# Altium footprint library TH_Connectors.PcbLib: 83 footprints (part 2 of 6)
Each footprint in its own frame and in the unit in brackets; x right, y up, seen from the top. Pads: shape width x height; smd on the part's side, far side on the other; paste and mask are expansions set on the pad; w line width, h text height; cw(c..) or ccw(c..) is an arc to the next point about the centre after c.
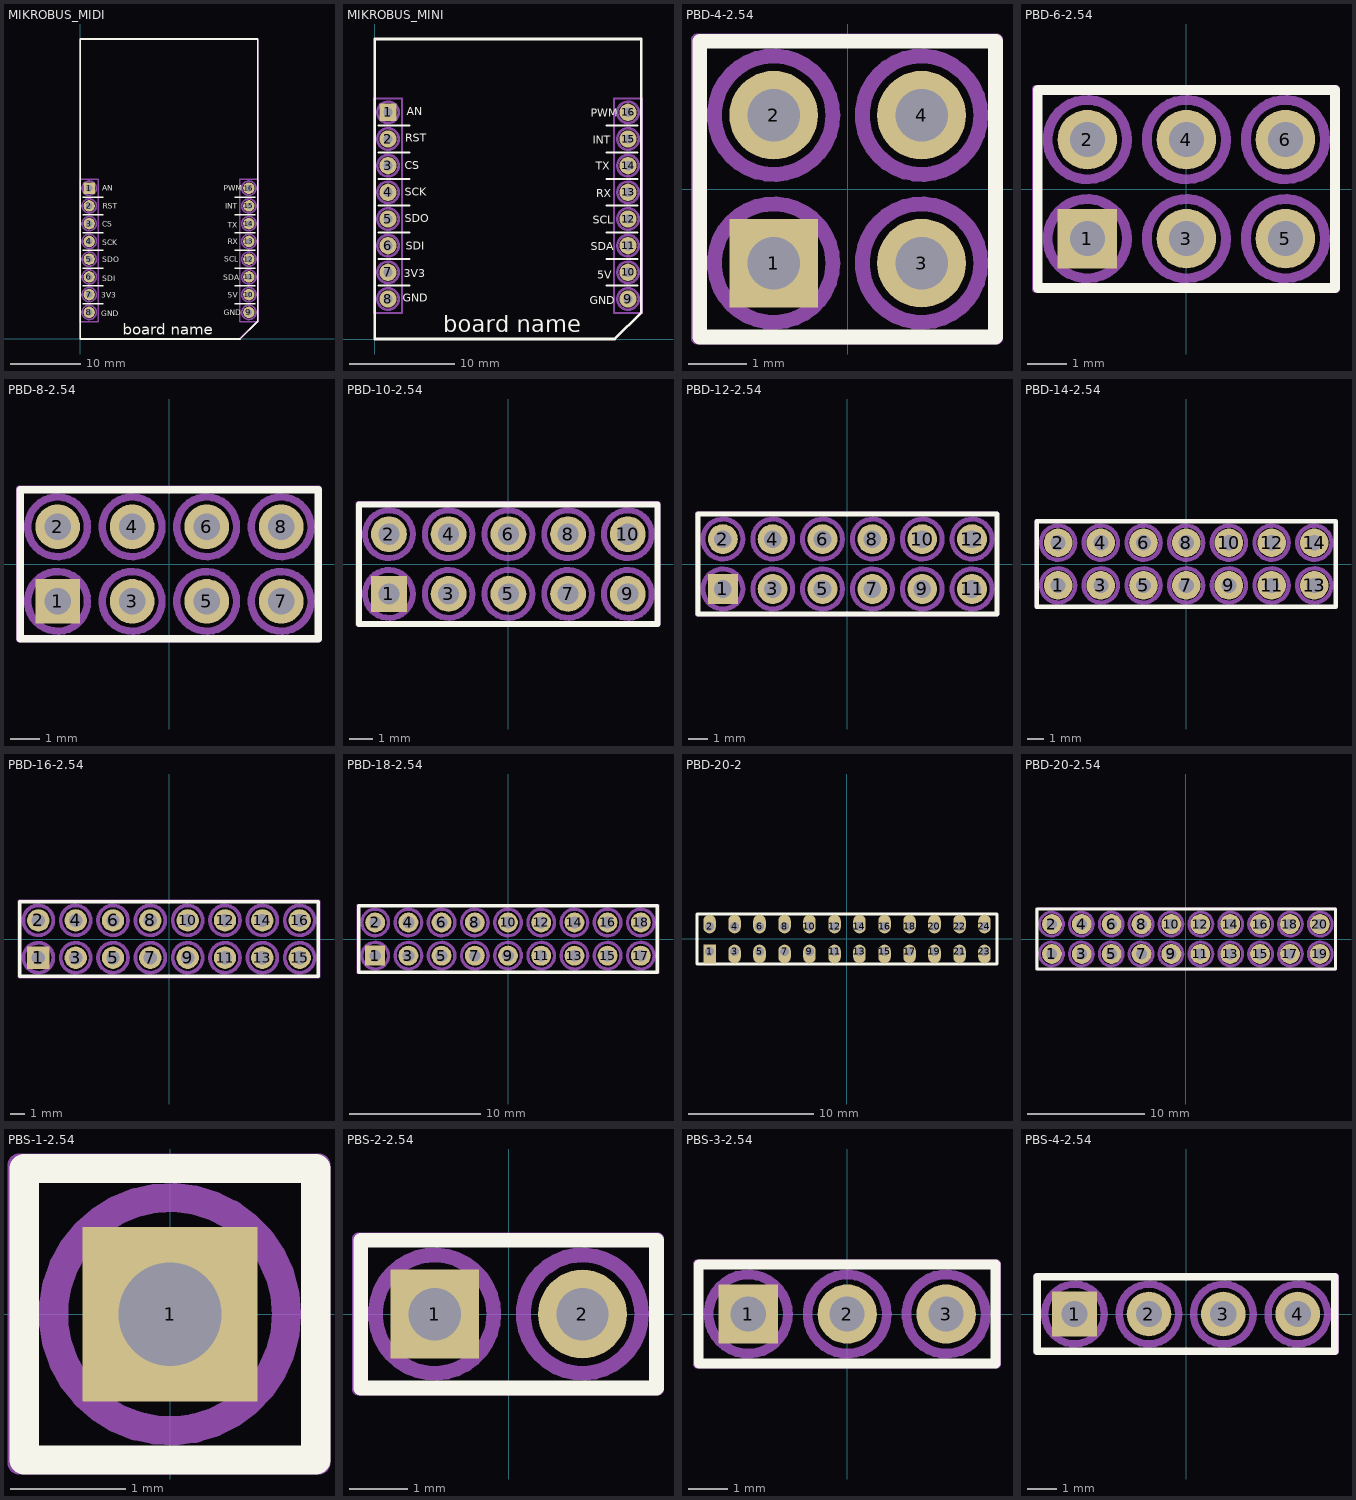
[diagram p1: the footprints below, top view; thin cyan lines are the x and y axes]

## MIKROBUS_MIDI [mil]
height 47.24
pads (16):
  rect 65x65 hole 35: 1(50,850)
  round 65 hole 35: 2(50,750) 3(50,650) 4(50,550) 5(50,450) 6(50,350) 7(50,250) 8(50,150) 9(950,150) 10(950,250) 11(950,350) 12(950,450) 13(950,550) 14(950,650) 15(950,750) 16(950,850)
Top Overlay:
  lines w8: 15,200 130,200 ; 15,300 130,300 ; 15,400 130,400 ; 15,500 130,500 ; 15,600 130,600 ; 15,700 130,700 ; 15,800 130,800 ; 870,200 985,200 ; 870,300 985,300 ; 870,400 985,400 ; 870,500 985,500 ; 870,600 985,600 ; 870,700 985,700 ; 870,800 985,800
  lines w10: 0,0 0,1690 1000,1690 1000,100 900,0 0,0 ; 0,0 0,0
  text "PWM" at 808.34,834.9 h30
  text "CS" at 123.39,632.87 h30
  text "TX" at 831.38,627.56 h30
  text "RX" at 830.49,533.62 h30
  text "SCL" at 810.99,434.38 h30
  text "SDA" at 806.56,332.48 h30
  text "GND" at 808.33,133.11 h30
  text "SDO" at 122.5,432.61 h30
  text "RST" at 125.16,733.88 h30
  text "INT" at 816.31,734.77 h30
  text "SCK" at 122.5,529.19 h30
  text "AN" at 122.5,834.9 h30
  text "SDI" at 122.5,326.27 h30
  text "5V" at 832.25,231.46 h30
  text "3V3" at 118.07,231.47 h30
  text "GND" at 117.18,129.57 h30
  text "board name" at 240.29,22.9 h60.94
Bottom Overlay:
  lines w8: 3,100 100,100 100,900 3,900 ; 997,100 900,100 900,900 997,900
  text "SCK" at 230,530 h35
  text "AN" at 200,830 h35
  text "TX" at 860,630 h35
  text "RX" at 860,530 h35
  text "5V" at 859.72,230.58 h35
  text "GND" at 860,130 h35
  text "PWM" at 860,830 h35
  text "RST" at 230,730 h35
  text "SDA" at 860,330 h35
  text "SDO" at 230,430 h35
  text "3V3" at 230,230 h35
  text "GND" at 233,130 h35
  text "CS" at 195,630 h35
  text "SDI" at 220,330 h35
  text "INT" at 860,730 h35
  text "SCL" at 860,430 h35
Keep-Out Layer:
  lines w6: 0,0 900,0 1000,100 1000,1690 0,1690 0,0
Border:
  lines w7.87: 0,0 0,1690.68 1000,1690.68 1000,100 900,0 0,0
Top Assembly:
  circle w10: c950,150 r40.04
  circle w10: c950,250 r40.04
  circle w10: c950,350 r40.04
  circle w10: c950,450 r40.04
  circle w10: c950,550 r40.04
  circle w10: c950,650 r40.04
  circle w10: c950,750 r40.04
  circle w10: c950,850 r40.04
  circle w10: c50,150 r40.04
  circle w10: c50,250 r40.04
  circle w10: c50,350 r40.04
  circle w10: c50,450 r40.04
  circle w10: c50,550 r40.04
  circle w10: c50,650 r40.04
  circle w10: c50,750 r40.04
  circle w10: c50,850 r40.04
Bottom Assembly:
  lines w7.87: -2.21,97.73 102.02,97.73 102.02,901.64 -2.21,901.64 -2.21,97.73 ; 897.79,97.73 1002.02,97.73 1002.02,901.64 897.79,901.64 897.79,97.73
3D body "User Library-PinHeaderX5-1.STEP": height 81.88, standoff -398.04, extent -7.96,400 107,900
3D body "User Library-PinHeaderX3.STEP": height 81.88, standoff -398.04, extent -7.96,100 107,400
3D body "User Library-PinHeaderX5-1.STEP": height 81.88, standoff -398.04, extent 892.52,400 1007.48,900
3D body "User Library-PinHeaderX3.STEP": height 81.88, standoff -398.04, extent 892.52,100 1007.48,400

## MIKROBUS_MINI [mil]
height 47.24
pads (16):
  rect 65x65 hole 35: 1(50,850)
  round 65 hole 35: 2(50,750) 3(50,650) 4(50,550) 5(50,450) 6(50,350) 7(50,250) 8(50,150) 9(950,150) 10(950,250) 11(950,350) 12(950,450) 13(950,550) 14(950,650) 15(950,750) 16(950,850)
Top Overlay:
  lines w8: 15,200 130,200 ; 15,300 130,300 ; 15,400 130,400 ; 15,500 130,500 ; 15,600 130,600 ; 15,700 130,700 ; 15,800 130,800 ; 870,200 985,200 ; 870,300 985,300 ; 870,400 985,400 ; 870,500 985,500 ; 870,600 985,600 ; 870,700 985,700 ; 870,800 985,800
  lines w10: 0,1125 0,0 900,0 1000,100 1000,1125 0,1125 ; 0,1125 0,1125
  text "GND" at 105.49,140.28 h30
  text "3V3" at 108.79,231.68 h30
  text "5V" at 834.31,225.97 h30
  text "SDI" at 115.77,333.95 h30
  text "AN" at 120.23,838.83 h30
  text "SCK" at 113.62,537.34 h30
  text "INT" at 818.3,731.79 h30
  text "RST" at 115.42,740.34 h30
  text "SDO" at 111.82,437.05 h30
  text "GND" at 805.86,129.97 h30
  text "SDA" at 809.42,332.64 h30
  text "SCL" at 817.42,433.09 h30
  text "RX" at 830.76,531.77 h30
  text "TX" at 828.97,634 h30
  text "CS" at 113.62,636.44 h30
  text "PWM" at 809.41,834.02 h30
  text "board name" at 256.31,25.05 h60.94
Bottom Overlay:
  lines w8: 3,100 100,100 100,900 3,900 ; 997,100 900,100 900,900 997,900
  text "SCL" at 860,430 h35
  text "INT" at 860,730 h35
  text "SDI" at 220,330 h35
  text "CS" at 195,630 h35
  text "GND" at 221.08,130.96 h35
  text "3V3" at 230,230 h35
  text "SDO" at 230,430 h35
  text "SDA" at 860,330 h35
  text "RST" at 230,730 h35
  text "PWM" at 860,830 h35
  text "GND" at 860,130 h35
  text "5V" at 860,230 h35
  text "RX" at 860,530 h35
  text "TX" at 852.98,632.22 h35
  text "AN" at 200,830 h35
  text "SCK" at 230,530 h35
Top Assembly:
  circle w10: c50,850 r40.04
  circle w10: c50,750 r40.04
  circle w10: c50,650 r40.04
  circle w10: c50,550 r40.04
  circle w10: c50,450 r40.04
  circle w10: c50,350 r40.04
  circle w10: c50,250 r40.04
  circle w10: c50,150 r40.04
  circle w10: c950,150 r40.04
  circle w10: c950,250 r40.04
  circle w10: c950,350 r40.04
  circle w10: c950,450 r40.04
  circle w10: c950,550 r40.04
  circle w10: c950,650 r40.04
  circle w10: c950,750 r40.04
  circle w10: c950,850 r40.04
Bottom Assembly:
  lines w7.87: -2.21,97.73 -2.21,901.64 102.02,901.64 102.02,97.73 -2.21,97.73 ; 897.79,97.73 897.79,901.64 1002.02,901.64 1002.02,97.73 897.79,97.73
3D body "User Library-PinHeaderX3.STEP": height 81.88, standoff -398.04, extent 892.52,100 1007.48,400
3D body "User Library-PinHeaderX5-1.STEP": height 81.88, standoff -398.04, extent 892.52,400 1007.48,900
3D body "User Library-PinHeaderX3.STEP": height 81.88, standoff -398.04, extent -7.96,100 107,400
3D body "User Library-PinHeaderX5-1.STEP": height 81.88, standoff -398.04, extent -7.96,400 107,900

## PBD-4-2.54 [mil]
pads (4):
  rect 60x60 hole 35.43: 1(-50,-50)
  round 60 hole 35.43: 2(-50,50) 3(50,-50) 4(50,50)
Top Overlay:
  lines w10: -100,-100 100,-100 100,100 -100,100 -100,-100
Top Assembly:
  lines w7.87: -101.81,-101.12 -101.81,101.38 101.01,101.38 101.01,-101.12 -101.81,-101.12
Bottom Assembly:
  circle w10: c50,-50 r40.05
  circle w10: c-50,-50 r40.05
  circle w10: c-50,50 r40.05
  circle w10: c50,50 r40.05
3D body "PBS1-2.54.stp": height 354.33, standoff -104.33, extent -100,0 0,100
3D body "PBS1-2.54.stp": height 354.33, standoff -104.33, extent -100,-100 0,0
3D body "PBS1-2.54.stp": height 354.33, standoff -104.33, extent 0,-100 100,0
3D body "PBS1-2.54.stp": height 354.33, standoff -104.33, extent 0,0 100,100

## PBD-6-2.54 [mil]
pads (6):
  rect 60x60 hole 35.43: 1(-100,-50)
  round 60 hole 35.43: 2(-100,50) 3(0,-50) 4(0,50) 5(100,-50) 6(100,50)
Top Overlay:
  lines w10: -150,-100 150,-100 150,100 -150,100 -150,-100
Top Assembly:
  lines w7.87: -151.81,-101.12 151.06,-101.12 151.06,101.38 -151.81,101.38 -151.81,-101.12
Bottom Assembly:
  circle w10: c-100,50 r40.05
  circle w10: c-100,-50 r40.05
  circle w10: c0,50 r40.05
  circle w10: c0,-50 r40.05
  circle w10: c100,50 r40.05
  circle w10: c100,-50 r40.05
3D body "PBS1-2.54.stp": height 354.33, standoff -104.33, extent -50,0 50,100
3D body "PBS1-2.54.stp": height 354.33, standoff -104.33, extent -150,0 -50,100
3D body "PBS1-2.54.stp": height 354.33, standoff -104.33, extent -150,-100 -50,0
3D body "PBS1-2.54.stp": height 354.33, standoff -104.33, extent -50,-100 50,0
3D body "PBS1-2.54.stp": height 354.33, standoff -104.33, extent 50,-100 150,0
3D body "PBS1-2.54.stp": height 354.33, standoff -104.33, extent 50,0 150,100

## PBD-8-2.54 [mil]
pads (8):
  rect 60x60 hole 35.43: 1(-150,-50)
  round 60 hole 35.43: 2(-150,50) 3(-50,-50) 4(-50,50) 5(50,-50) 6(50,50) 7(150,-50) 8(150,50)
Top Overlay:
  lines w10: -200,-100 200,-100 200,100 -200,100 -200,-100
Top Assembly:
  lines w7.87: -201.81,-101.12 -201.81,101.38 200.74,101.38 200.74,-101.12 -201.81,-101.12
Bottom Assembly:
  circle w10: c150,50 r40.05
  circle w10: c150,-50 r40.05
  circle w10: c-150,50 r40.05
  circle w10: c-150,-50 r40.05
  circle w10: c-50,50 r40.05
  circle w10: c-50,-50 r40.05
  circle w10: c50,50 r40.05
  circle w10: c50,-50 r40.05
3D body "PBS1-2.54.stp": height 354.33, standoff -104.33, extent -200,0 -100,100
3D body "PBS1-2.54.stp": height 354.33, standoff -104.33, extent -100,0 0,100
3D body "PBS1-2.54.stp": height 354.33, standoff -104.33, extent -100,-100 0,0
3D body "PBS1-2.54.stp": height 354.33, standoff -104.33, extent -200,-100 -100,0
3D body "PBS1-2.54.stp": height 354.33, standoff -104.33, extent 0,0 100,100
3D body "PBS1-2.54.stp": height 354.33, standoff -104.33, extent 0,-100 100,0
3D body "PBS1-2.54.stp": height 354.33, standoff -104.33, extent 100,-100 200,0
3D body "PBS1-2.54.stp": height 354.33, standoff -104.33, extent 100,0 200,100

## PBD-10-2.54 [mil]
pads (10):
  rect 60x60 hole 35.43: 1(-200,-50)
  round 60 hole 35.43: 2(-200,50) 3(-100,-50) 4(-100,50) 5(0,-50) 6(0,50) 7(100,-50) 8(100,50) 9(200,-50) 10(200,50)
Top Overlay:
  lines w10: -250,-100 250,-100 250,100 -250,100 -250,-100
Top Assembly:
  lines w7.87: -251.81,-101.12 -251.81,101.38 250.57,101.38 250.57,-101.12 -251.81,-101.12
Bottom Assembly:
  circle w10: c200,50 r40.05
  circle w10: c200,-50 r40.05
  circle w10: c100,50 r40.05
  circle w10: c100,-50 r40.05
  circle w10: c0,50 r40.05
  circle w10: c0,-50 r40.05
  circle w10: c-100,50 r40.05
  circle w10: c-100,-50 r40.05
  circle w10: c-200,50 r40.05
  circle w10: c-200,-50 r40.05
3D body "PBS1-2.54.stp": height 354.33, standoff -104.33, extent -250,0 -150,100
3D body "PBS1-2.54.stp": height 354.33, standoff -104.33, extent -250,-100 -150,0
3D body "PBS1-2.54.stp": height 354.33, standoff -104.33, extent -150,-100 -50,0
3D body "PBS1-2.54.stp": height 354.33, standoff -104.33, extent -150,0 -50,100
3D body "PBS1-2.54.stp": height 354.33, standoff -104.33, extent -50,0 50,100
3D body "PBS1-2.54.stp": height 354.33, standoff -104.33, extent -50,-100 50,0
3D body "PBS1-2.54.stp": height 354.33, standoff -104.33, extent 50,-100 150,0
3D body "PBS1-2.54.stp": height 354.33, standoff -104.33, extent 50,0 150,100
3D body "PBS1-2.54.stp": height 354.33, standoff -104.33, extent 150,0 250,100
3D body "PBS1-2.54.stp": height 354.33, standoff -104.33, extent 150,-100 250,0

## PBD-12-2.54 [mil]
pads (12):
  rect 60x60 hole 35.43: 1(-250,-50)
  round 60 hole 35.43: 2(-250,50) 3(-150,-50) 4(-150,50) 5(-50,-50) 6(-50,50) 7(50,-50) 8(50,50) 9(150,-50) 10(150,50) 11(250,-50) 12(250,50)
Top Overlay:
  lines w10: -300,-100 -300,100 300,100 300,-100 -300,-100
Top Assembly:
  lines w7.87: -301.81,-101.12 -301.81,101.38 300,101.38 300,-101.12 -301.81,-101.12
Bottom Assembly:
  circle w10: c250,50 r40.05
  circle w10: c250,-50 r40.05
  circle w10: c150,50 r40.05
  circle w10: c150,-50 r40.05
  circle w10: c50,50 r40.05
  circle w10: c50,-50 r40.05
  circle w10: c-50,50 r40.05
  circle w10: c-50,-50 r40.05
  circle w10: c-150,50 r40.05
  circle w10: c-150,-50 r40.05
  circle w10: c-250,50 r40.05
  circle w10: c-250,-50 r40.05
3D body "PBS1-2.54.stp": height 354.33, standoff -104.33, extent -300,0 -200,100
3D body "PBS1-2.54.stp": height 354.33, standoff -104.33, extent -300,-100 -200,0
3D body "PBS1-2.54.stp": height 354.33, standoff -104.33, extent -200,-100 -100,0
3D body "PBS1-2.54.stp": height 354.33, standoff -104.33, extent -200,0 -100,100
3D body "PBS1-2.54.stp": height 354.33, standoff -104.33, extent -100,0 0,100
3D body "PBS1-2.54.stp": height 354.33, standoff -104.33, extent -100,-100 0,0
3D body "PBS1-2.54.stp": height 354.33, standoff -104.33, extent 0,0 100,100
3D body "PBS1-2.54.stp": height 354.33, standoff -104.33, extent 0,-100 100,0
3D body "PBS1-2.54.stp": height 354.33, standoff -104.33, extent 100,0 200,100
3D body "PBS1-2.54.stp": height 354.33, standoff -104.33, extent 100,-100 200,0
3D body "PBS1-2.54.stp": height 354.33, standoff -104.33, extent 200,0 300,100
3D body "PBS1-2.54.stp": height 354.33, standoff -104.33, extent 200,-100 300,0

## PBD-14-2.54 [mm]
pads (14):
  round 1.7 hole 0.9: 1(-7.62,-1.27) 2(-7.62,1.27) 3(-5.08,-1.27) 4(-5.08,1.27) 5(-2.54,-1.27) 6(-2.54,1.27) 7(0,-1.27) 8(0,1.27) 9(2.54,-1.27) 10(2.54,1.27) 11(5.08,-1.27) 12(5.08,1.27) 13(7.62,-1.27) 14(7.62,1.27)
Top Overlay:
  lines w0.254: -8.89,-2.54 -8.89,2.54 8.89,2.54 8.89,-2.54 -8.89,-2.54
Top Assembly:
  lines w0.2: -8.936,-2.569 -8.936,2.575 8.91,2.575 8.91,-2.569 -8.936,-2.569
Bottom Assembly:
  circle w0.254: c7.62,1.27 r1.017
  circle w0.254: c7.62,-1.27 r1.017
  circle w0.254: c5.08,1.27 r1.017
  circle w0.254: c5.08,-1.27 r1.017
  circle w0.254: c2.54,1.27 r1.017
  circle w0.254: c2.54,-1.27 r1.017
  circle w0.254: c0,1.27 r1.017
  circle w0.254: c0,-1.27 r1.017
  circle w0.254: c-2.54,1.27 r1.017
  circle w0.254: c-2.54,-1.27 r1.017
  circle w0.254: c-5.08,1.27 r1.017
  circle w0.254: c-5.08,-1.27 r1.017
  circle w0.254: c-7.62,1.27 r1.017
  circle w0.254: c-7.62,-1.27 r1.017
3D body "PBS1-2.54.stp": height 9, standoff -2.65, extent -8.89,0 -6.35,2.54
3D body "PBS1-2.54.stp": height 9, standoff -2.65, extent -8.89,-2.54 -6.35,0
3D body "PBS1-2.54.stp": height 9, standoff -2.65, extent -6.35,-2.54 -3.81,0
3D body "PBS1-2.54.stp": height 9, standoff -2.65, extent -6.35,0 -3.81,2.54
3D body "PBS1-2.54.stp": height 9, standoff -2.65, extent -3.81,-2.54 -1.27,0
3D body "PBS1-2.54.stp": height 9, standoff -2.65, extent -1.27,-2.54 1.27,0
3D body "PBS1-2.54.stp": height 9, standoff -2.65, extent -1.27,0 1.27,2.54
3D body "PBS1-2.54.stp": height 9, standoff -2.65, extent 1.27,-2.54 3.81,0
3D body "PBS1-2.54.stp": height 9, standoff -2.65, extent 1.27,0 3.81,2.54
3D body "PBS1-2.54.stp": height 9, standoff -2.65, extent 3.81,-2.54 6.35,0
3D body "PBS1-2.54.stp": height 9, standoff -2.65, extent 3.81,0 6.35,2.54
3D body "PBS1-2.54.stp": height 9, standoff -2.65, extent 6.35,-2.54 8.89,0
3D body "PBS1-2.54.stp": height 9, standoff -2.65, extent 6.35,0 8.89,2.54
3D body "PBS1-2.54.stp": height 9, standoff -2.65, extent -3.81,0 -1.27,2.54

## PBD-16-2.54 [mil]
pads (16):
  rect 60x60 hole 35.43: 1(-350,-50)
  round 60 hole 35.43: 2(-350,50) 3(-250,-50) 4(-250,50) 5(-150,-50) 6(-150,50) 7(-50,-50) 8(-50,50) 9(50,-50) 10(50,50) 11(150,-50) 12(150,50) 13(250,-50) 14(250,50) 15(350,-50) 16(350,50)
Top Overlay:
  lines w10: -400,-100 -400,100 400,100 400,-100 -400,-100
Top Assembly:
  lines w7.87: -401.81,-101.12 -401.81,101.38 401.76,101.38 401.76,-101.12 -401.81,-101.12
Bottom Assembly:
  circle w10: c350,50 r40.05
  circle w10: c350,-50 r40.05
  circle w10: c250,50 r40.05
  circle w10: c250,-50 r40.05
  circle w10: c150,50 r40.05
  circle w10: c150,-50 r40.05
  circle w10: c50,50 r40.05
  circle w10: c50,-50 r40.05
  circle w10: c-50,50 r40.05
  circle w10: c-50,-50 r40.05
  circle w10: c-150,50 r40.05
  circle w10: c-150,-50 r40.05
  circle w10: c-250,50 r40.05
  circle w10: c-250,-50 r40.05
  circle w10: c-350,50 r40.05
  circle w10: c-350,-50 r40.05
3D body "PBS1-2.54.stp": height 354.33, standoff -104.33, extent -400,-100 -300,0
3D body "PBS1-2.54.stp": height 354.33, standoff -104.33, extent -300,-100 -200,0
3D body "PBS1-2.54.stp": height 354.33, standoff -104.33, extent -200,-100 -100,0
3D body "PBS1-2.54.stp": height 354.33, standoff -104.33, extent -100,-100 0,0
3D body "PBS1-2.54.stp": height 354.33, standoff -104.33, extent 0,-100 100,0
3D body "PBS1-2.54.stp": height 354.33, standoff -104.33, extent 100,-100 200,0
3D body "PBS1-2.54.stp": height 354.33, standoff -104.33, extent 200,-100 300,0
3D body "PBS1-2.54.stp": height 354.33, standoff -104.33, extent 300,-100 400,0
3D body "PBS1-2.54.stp": height 354.33, standoff -104.33, extent 300,0 400,100
3D body "PBS1-2.54.stp": height 354.33, standoff -104.33, extent 200,0 300,100
3D body "PBS1-2.54.stp": height 354.33, standoff -104.33, extent 100,0 200,100
3D body "PBS1-2.54.stp": height 354.33, standoff -104.33, extent 0,0 100,100
3D body "PBS1-2.54.stp": height 354.33, standoff -104.33, extent -100,0 0,100
3D body "PBS1-2.54.stp": height 354.33, standoff -104.33, extent -200,0 -100,100
3D body "PBS1-2.54.stp": height 354.33, standoff -104.33, extent -300,0 -200,100
3D body "PBS1-2.54.stp": height 354.33, standoff -104.33, extent -400,0 -300,100

## PBD-18-2.54 [mil]
pads (18):
  rect 60x60 hole 35.43: 1(-400,-50)
  round 60 hole 35.43: 2(-400,50) 3(-300,-50) 4(-300,50) 5(-200,-50) 6(-200,50) 7(-100,-50) 8(-100,50) 9(0,-50) 10(0,50) 11(100,-50) 12(100,50) 13(200,-50) 14(200,50) 15(300,-50) 16(300,50) 17(400,-50) 18(400,50)
Top Overlay:
  lines w10: -450,-100 450,-100 450,100 -450,100 -450,-100
Top Assembly:
  lines w7.87: -451.81,-101.12 -451.81,101.38 451.81,101.38 451.81,-101.12 -451.81,-101.12
Bottom Assembly:
  circle w10: c400,50 r40.05
  circle w10: c400,-50 r40.05
  circle w10: c300,50 r40.05
  circle w10: c300,-50 r40.05
  circle w10: c200,50 r40.05
  circle w10: c200,-50 r40.05
  circle w10: c100,50 r40.05
  circle w10: c100,-50 r40.05
  circle w10: c0,50 r40.05
  circle w10: c0,-50 r40.05
  circle w10: c-100,50 r40.05
  circle w10: c-100,-50 r40.05
  circle w10: c-200,50 r40.05
  circle w10: c-200,-50 r40.05
  circle w10: c-300,50 r40.05
  circle w10: c-300,-50 r40.05
  circle w10: c-400,50 r40.05
  circle w10: c-400,-50 r40.05
3D body "PBS1-2.54.stp": height 354.33, standoff -104.33, extent -450,0 -350,100
3D body "PBS1-2.54.stp": height 354.33, standoff -104.33, extent -350,0 -250,100
3D body "PBS1-2.54.stp": height 354.33, standoff -104.33, extent -250,0 -150,100
3D body "PBS1-2.54.stp": height 354.33, standoff -104.33, extent -150,0 -50,100
3D body "PBS1-2.54.stp": height 354.33, standoff -104.33, extent -50,0 50,100
3D body "PBS1-2.54.stp": height 354.33, standoff -104.33, extent 50,0 150,100
3D body "PBS1-2.54.stp": height 354.33, standoff -104.33, extent 150,0 250,100
3D body "PBS1-2.54.stp": height 354.33, standoff -104.33, extent 250,0 350,100
3D body "PBS1-2.54.stp": height 354.33, standoff -104.33, extent 350,0 450,100
3D body "PBS1-2.54.stp": height 354.33, standoff -104.33, extent 350,-100 450,0
3D body "PBS1-2.54.stp": height 354.33, standoff -104.33, extent 250,-100 350,0
3D body "PBS1-2.54.stp": height 354.33, standoff -104.33, extent 150,-100 250,0
3D body "PBS1-2.54.stp": height 354.33, standoff -104.33, extent 50,-100 150,0
3D body "PBS1-2.54.stp": height 354.33, standoff -104.33, extent -50,-100 50,0
3D body "PBS1-2.54.stp": height 354.33, standoff -104.33, extent -150,-100 -50,0
3D body "PBS1-2.54.stp": height 354.33, standoff -104.33, extent -250,-100 -150,0
3D body "PBS1-2.54.stp": height 354.33, standoff -104.33, extent -350,-100 -250,0
3D body "PBS1-2.54.stp": height 354.33, standoff -104.33, extent -450,-100 -350,0

## PBD-20-2 [mm]
pads (24):
  rect 1x1.5 hole 0.7 copper offset 0,-0.2: 1(-11,-1)
  oval 1x1.5 hole 0.7 copper offset 0,0.2: 2(-11,1) 4(-9,1) 6(-7,1) 8(-5,1) 10(-3,1) 12(-1,1) 14(1,1) 16(3,1) 18(5,1) 20(7,1) 22(9,1) 24(11,1)
  oval 1x1.5 hole 0.7 copper offset 0,-0.2: 3(-9,-1) 5(-7,-1) 7(-5,-1) 9(-3,-1) 11(-1,-1) 13(1,-1) 15(3,-1) 17(5,-1) 19(7,-1) 21(9,-1) 23(11,-1)
Top Overlay:
  lines w0.254: -12,-2 12,-2 12,2 -12,2 -12,-2
3D body "User Library-PBS2-4.STEP": height 4.3, standoff -3.15, extent 4,0 12,2
3D body "User Library-PBS2-4.STEP": height 4.3, standoff -3.15, extent 4,-2 12,0
3D body "User Library-PBS2-4.STEP": height 4.3, standoff -3.15, extent -12,-2 -4,0
3D body "User Library-PBS2-4.STEP": height 4.3, standoff -3.15, extent -12,0 -4,2
3D body "User Library-PBS2-4.STEP": height 4.3, standoff -3.15, extent -4,0 4,2
3D body "User Library-PBS2-4.STEP": height 4.3, standoff -3.15, extent -4,-2 4,0

## PBD-20-2.54 [mm]
pads (20):
  round 1.7 hole 0.9: 1(-11.39,-1.27) 2(-11.39,1.27) 3(-8.85,-1.27) 4(-8.85,1.27) 5(-6.31,-1.27) 6(-6.31,1.27) 7(-3.77,-1.27) 8(-3.77,1.27) 9(-1.23,-1.27) 10(-1.23,1.27) 11(1.23,-1.27) 12(1.23,1.27) 13(3.77,-1.27) 14(3.77,1.27) 15(6.31,-1.27) 16(6.31,1.27) 17(8.85,-1.27) 18(8.85,1.27) 19(11.39,-1.27) 20(11.39,1.27)
Top Overlay:
  lines w0.254: -12.66,-2.54 -12.66,2.54 12.736,2.54 12.736,-2.54 -12.66,-2.54
Top Assembly:
  lines w0.2: -12.746,-2.569 12.768,-2.569 12.768,2.575 -12.746,2.575 -12.746,-2.569
Bottom Assembly:
  circle w0.254: c11.43,-1.27 r1.017
  circle w0.254: c11.43,1.27 r1.017
  circle w0.254: c8.89,-1.27 r1.017
  circle w0.254: c8.89,1.27 r1.017
  circle w0.254: c6.35,-1.27 r1.017
  circle w0.254: c6.35,1.27 r1.017
  circle w0.254: c3.81,-1.27 r1.017
  circle w0.254: c3.81,1.27 r1.017
  circle w0.254: c1.27,-1.27 r1.017
  circle w0.254: c1.27,1.27 r1.017
  circle w0.254: c-1.27,-1.27 r1.017
  circle w0.254: c-1.27,1.27 r1.017
  circle w0.254: c-3.81,-1.27 r1.017
  circle w0.254: c-3.81,1.27 r1.017
  circle w0.254: c-6.35,-1.27 r1.017
  circle w0.254: c-6.35,1.27 r1.017
  circle w0.254: c-8.89,-1.27 r1.017
  circle w0.254: c-8.89,1.27 r1.017
  circle w0.254: c-11.43,-1.27 r1.017
  circle w0.254: c-11.43,1.27 r1.017
3D body "PBS1-2.54.stp": height 9, standoff -2.65, extent 2.58,0 5.12,2.54
3D body "PBS1-2.54.stp": height 9, standoff -2.65, extent 2.58,-2.54 5.12,0
3D body "PBS1-2.54.stp": height 9, standoff -2.65, extent -2.5,0 0.04,2.54
3D body "PBS1-2.54.stp": height 9, standoff -2.65, extent -2.5,-2.54 0.04,0
3D body "PBS1-2.54.stp": height 9, standoff -2.65, extent 0.04,-2.54 2.58,0
3D body "PBS1-2.54.stp": height 9, standoff -2.65, extent 0.04,0 2.58,2.54
3D body "PBS1-2.54.stp": height 9, standoff -2.65, extent -7.58,0 -5.04,2.54
3D body "PBS1-2.54.stp": height 9, standoff -2.65, extent -7.58,-2.54 -5.04,0
3D body "PBS1-2.54.stp": height 9, standoff -2.65, extent -5.04,-2.54 -2.5,0
3D body "PBS1-2.54.stp": height 9, standoff -2.65, extent -5.04,0 -2.5,2.54
3D body "PBS1-2.54.stp": height 9, standoff -2.65, extent -10.12,0 -7.58,2.54
3D body "PBS1-2.54.stp": height 9, standoff -2.65, extent -10.12,-2.54 -7.58,0
3D body "PBS1-2.54.stp": height 9, standoff -2.65, extent -12.66,-2.54 -10.12,0
3D body "PBS1-2.54.stp": height 9, standoff -2.65, extent -12.66,0 -10.12,2.54
3D body "PBS1-2.54.stp": height 9, standoff -2.65, extent 10.196,0.001 12.736,2.541
3D body "PBS1-2.54.stp": height 9, standoff -2.65, extent 10.196,-2.539 12.736,0.001
3D body "PBS1-2.54.stp": height 9, standoff -2.65, extent 5.116,0.001 7.656,2.541
3D body "PBS1-2.54.stp": height 9, standoff -2.65, extent 5.116,-2.539 7.656,0.001
3D body "PBS1-2.54.stp": height 9, standoff -2.65, extent 7.656,-2.539 10.196,0.001
3D body "PBS1-2.54.stp": height 9, standoff -2.65, extent 7.656,0.001 10.196,2.541

## PBS-1-2.54 [mil]
pads (1):
  rect 60x60 hole 35.43: 1(0,0)
Top Overlay:
  lines w10: -50,-50 -50,50 50,50 50,-50 -50,-50
Top Assembly:
  lines w7.87: -51.81,-51.12 51.12,-51.12 51.12,51.25 -51.81,51.25 -51.81,-51.12
Bottom Assembly:
  circle w10: c0,0 r40.05
3D body "User Library-PBS-01.STEP": height 330.71, standoff -125.98, extent -50,-50 50,50

## PBS-2-2.54 [mil]
pads (2):
  rect 60x60 hole 35.43: 1(-50,0)
  round 60 hole 35.43: 2(50,0)
Top Overlay:
  lines w10: -100,-50 -100,50 100,50 100,-50 -100,-50
Top Assembly:
  lines w7.87: -101.81,-51.12 -101.81,51.25 101.08,51.25 101.08,-51.12 -101.81,-51.12
Bottom Assembly:
  circle w10: c-50,0 r40.05
  circle w10: c50,0 r40.05
3D body "User Library-PBS-01.STEP": height 330.71, standoff -125.98, extent 0,-50 100,50
3D body "User Library-PBS-01.STEP": height 330.71, standoff -125.98, extent -100,-50 0,50

## PBS-3-2.54 [mil]
pads (3):
  rect 60x60 hole 35.43: 1(-100,0)
  round 60 hole 35.43: 2(0,0) 3(100,0)
Top Overlay:
  lines w10: -150,-50 -150,50 150,50 150,-50 -150,-50
Top Assembly:
  lines w7.87: -151.81,-51.12 -151.81,51.25 151.43,51.25 151.43,-51.12 -151.81,-51.12
Bottom Assembly:
  circle w10: c100,0 r40.05
  circle w10: c0,0 r40.05
  circle w10: c-100,0 r40.05
3D body "User Library-PBS-01.STEP": height 330.71, standoff -125.98, extent -150,-50 -50,50
3D body "User Library-PBS-01.STEP": height 330.71, standoff -125.98, extent -50,-50 50,50
3D body "User Library-PBS-01.STEP": height 330.71, standoff -125.98, extent 50,-50 150,50

## PBS-4-2.54 [mil]
pads (4):
  rect 60x60 hole 35.43: 1(-150,0)
  round 60 hole 35.43: 2(-50,0) 3(50,0) 4(150,0)
Top Overlay:
  lines w10: -200,-50 -200,50 200,50 200,-50 -200,-50
Top Assembly:
  lines w7.87: -201.81,-51.12 -201.81,51.25 201.47,51.25 201.47,-51.12 -201.81,-51.12
Bottom Assembly:
  circle w10: c150,0 r40.05
  circle w10: c50,0 r40.05
  circle w10: c-50,0 r40.05
  circle w10: c-150,0 r40.05
3D body "User Library-PBS-01.STEP": height 330.71, standoff -125.98, extent 100,-50 200,50
3D body "User Library-PBS-01.STEP": height 330.71, standoff -125.98, extent 0,-50 100,50
3D body "User Library-PBS-01.STEP": height 330.71, standoff -125.98, extent -100,-50 0,50
3D body "User Library-PBS-01.STEP": height 330.71, standoff -125.98, extent -200,-50 -100,50